# Altium footprint library COMATEL THD.PcbLib: 70 footprints (part 2 of 5)
Each footprint in its own frame and in the unit in brackets; x right, y up, seen from the top. Pads: shape width x height; smd on the part's side, far side on the other; paste and mask are expansions set on the pad; w line width, h text height; cw(c..) or ccw(c..) is an arc to the next point about the centre after c.
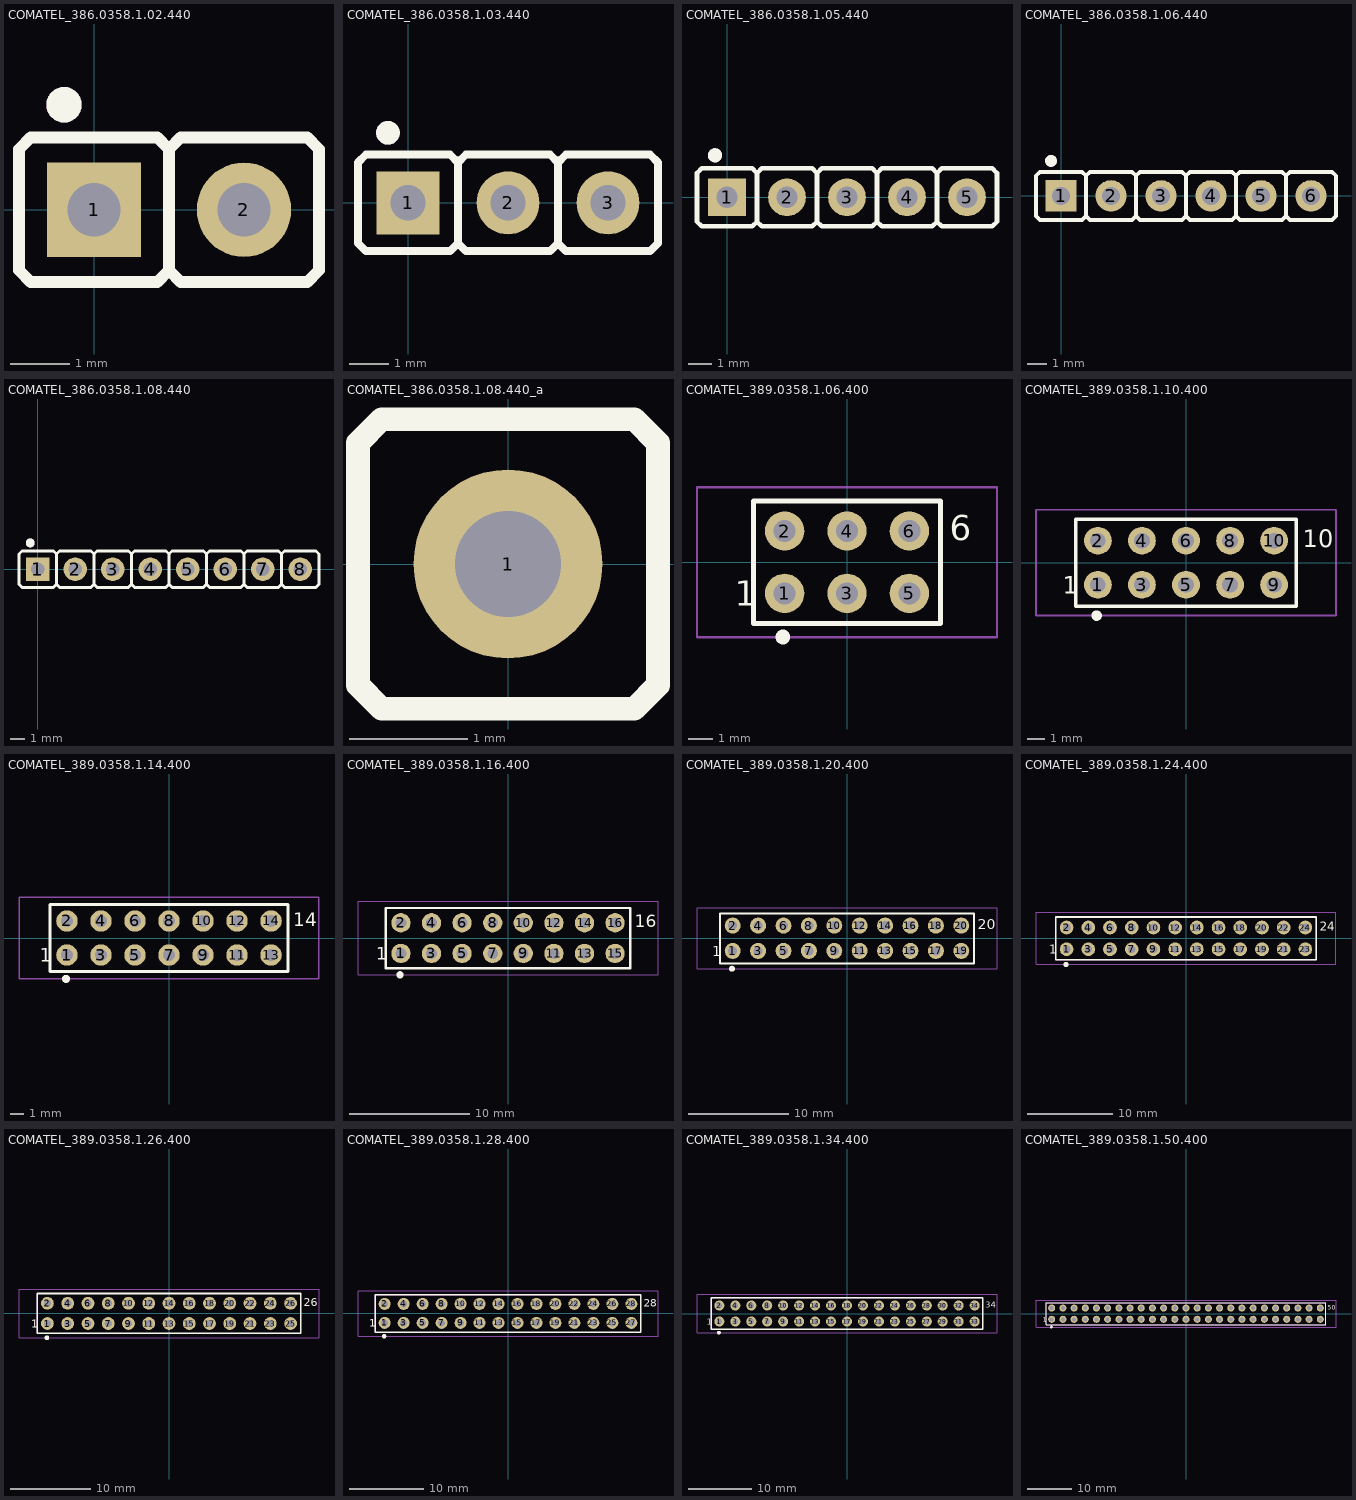
[diagram p1: the footprints below, top view; thin cyan lines are the x and y axes]

## COMATEL_386.0358.1.02.440 [mm] "2 Contacts Straight Strip Header Pitch 2.54mm L=6.3mm ''Mini-Wire-Wrap''"
height 8
pads (2):
  rect 1.6x1.6 hole 0.9: 1(0,0)
  round 1.6 hole 0.9: 2(2.54,0)
Top Overlay:
  circle w0.3: c-0.508,1.778 r0.15
  lines w0.2: 1.27,-1.025 1.47,-1.225 3.61,-1.225 3.81,-1.025 3.81,1.025 3.61,1.225 1.47,1.225 1.27,1.025 ; 1.27,-1.025 1.27,1.025 ; 1.27,-1.025 1.07,-1.225 -1.07,-1.225 -1.27,-1.025 -1.27,1.025 -1.07,1.225 1.07,1.225 1.27,1.025
Mechanical 14:
  circle w0.3: c-0.508,1.778 r0.15
  lines w0.1: 1.27,-1.025 1.47,-1.225 3.61,-1.225 3.81,-1.025 3.81,1.025 3.61,1.225 1.47,1.225 1.27,1.025 ; 1.27,-1.025 1.27,1.025 ; 1.27,-1.025 1.07,-1.225 -1.07,-1.225 -1.27,-1.025 -1.27,1.025 -1.07,1.225 1.07,1.225 1.27,1.025
3D body "COMATEL_386.0358.1.02.440.stp": height 8, standoff -3.2, extent -1.27,-1.225 3.81,1.225

## COMATEL_386.0358.1.03.440 [mm] "3 Contacts Straight Strip Header Pitch 2.54mm L=6.3mm ''Mini-Wire-Wrap''"
height 8
pads (3):
  rect 1.6x1.6 hole 0.9: 1(0,0)
  round 1.6 hole 0.9: 2(2.54,0) 3(5.08,0)
Top Overlay:
  circle w0.3: c-0.508,1.778 r0.15
  lines w0.2: 1.27,-1.025 1.07,-1.225 -1.07,-1.225 -1.27,-1.025 -1.27,1.025 -1.07,1.225 1.07,1.225 1.27,1.025 ; 1.27,-1.025 1.27,1.025 ; 1.27,-1.025 1.47,-1.225 3.61,-1.225 3.81,-1.025 ; 1.27,1.025 1.47,1.225 3.61,1.225 3.81,1.025 ; 3.81,-1.025 3.81,1.025 ; 3.81,-1.025 4.01,-1.225 6.15,-1.225 6.35,-1.025 6.35,1.025 6.15,1.225 4.01,1.225 3.81,1.025
Mechanical 14:
  circle w0.3: c-0.508,1.778 r0.15
  lines w0.1: 1.27,-1.025 1.07,-1.225 -1.07,-1.225 -1.27,-1.025 -1.27,1.025 -1.07,1.225 1.07,1.225 1.27,1.025 ; 1.27,-1.025 1.27,1.025 ; 1.27,-1.025 1.47,-1.225 3.61,-1.225 3.81,-1.025 ; 1.27,1.025 1.47,1.225 3.61,1.225 3.81,1.025 ; 3.81,-1.025 3.81,1.025 ; 3.81,-1.025 4.01,-1.225 6.15,-1.225 6.35,-1.025 6.35,1.025 6.15,1.225 4.01,1.225 3.81,1.025
3D body "COMATEL_386.0358.1.03.440.stp": height 8, standoff -3.2, extent -1.27,-1.225 6.35,1.225

## COMATEL_386.0358.1.05.440 [mm] "5 Contacts Straight Strip Header Pitch 2.54mm L=6.3mm ''Mini-Wire-Wrap''"
height 8
pads (5):
  rect 1.6x1.6 hole 0.9: 1(0,0)
  round 1.6 hole 0.9: 2(2.54,0) 3(5.08,0) 4(7.62,0) 5(10.16,0)
Top Overlay:
  circle w0.3: c-0.508,1.778 r0.15
  lines w0.2: 1.27,-1.025 1.07,-1.225 -1.07,-1.225 -1.27,-1.025 -1.27,1.025 -1.07,1.225 1.07,1.225 1.27,1.025 ; 1.27,-1.025 1.27,1.025 ; 1.27,-1.025 1.47,-1.225 3.61,-1.225 3.81,-1.025 ; 1.27,1.025 1.47,1.225 3.61,1.225 3.81,1.025 ; 3.81,-1.025 3.81,1.025 ; 3.81,-1.025 4.01,-1.225 6.15,-1.225 6.35,-1.025 ; 3.81,1.025 4.01,1.225 6.15,1.225 6.35,1.025 ; 6.35,-1.025 6.35,1.025 ; 6.35,-1.025 6.55,-1.225 8.69,-1.225 8.89,-1.025 ; 6.35,1.025 6.55,1.225 8.69,1.225 8.89,1.025 ; 8.89,-1.025 9.09,-1.225 11.23,-1.225 11.43,-1.025 11.43,1.025 11.23,1.225 9.09,1.225 8.89,1.025 ; 8.89,-1.025 8.89,1.025
Mechanical 14:
  circle w0.3: c-0.508,1.778 r0.15
  lines w0.1: 1.27,-1.025 1.07,-1.225 -1.07,-1.225 -1.27,-1.025 -1.27,1.025 -1.07,1.225 1.07,1.225 1.27,1.025 ; 1.27,-1.025 1.27,1.025 ; 1.27,-1.025 1.47,-1.225 3.61,-1.225 3.81,-1.025 ; 1.27,1.025 1.47,1.225 3.61,1.225 3.81,1.025 ; 3.81,-1.025 3.81,1.025 ; 3.81,-1.025 4.01,-1.225 6.15,-1.225 6.35,-1.025 ; 3.81,1.025 4.01,1.225 6.15,1.225 6.35,1.025 ; 6.35,-1.025 6.55,-1.225 8.69,-1.225 8.89,-1.025 ; 6.35,-1.025 6.35,1.025 ; 6.35,1.025 6.55,1.225 8.69,1.225 8.89,1.025 ; 8.89,-1.025 9.09,-1.225 11.23,-1.225 11.43,-1.025 11.43,1.025 11.23,1.225 9.09,1.225 8.89,1.025 ; 8.89,-1.025 8.89,1.025
3D body "COMATEL_386.0358.1.05.440.stp": height 8, standoff -3.2, extent -1.27,-1.225 11.43,1.225

## COMATEL_386.0358.1.06.440 [mm] "6 Contacts Straight Strip Header Pitch 2.54mm L=6.3mm ''Mini-Wire-Wrap''"
height 8
pads (6):
  rect 1.6x1.6 hole 0.9: 1(0,0)
  round 1.6 hole 0.9: 2(2.54,0) 3(5.08,0) 4(7.62,0) 5(10.16,0) 6(12.7,0)
Top Overlay:
  circle w0.3: c-0.508,1.778 r0.15
  lines w0.2: 1.27,-1.025 1.07,-1.225 -1.07,-1.225 -1.27,-1.025 -1.27,1.025 -1.07,1.225 1.07,1.225 1.27,1.025 ; 1.27,-1.025 1.27,1.025 ; 1.27,-1.025 1.47,-1.225 3.61,-1.225 3.81,-1.025 ; 1.27,1.025 1.47,1.225 3.61,1.225 3.81,1.025 ; 3.81,-1.025 3.81,1.025 ; 3.81,-1.025 4.01,-1.225 6.15,-1.225 6.35,-1.025 ; 3.81,1.025 4.01,1.225 6.15,1.225 6.35,1.025 ; 6.35,-1.025 6.35,1.025 ; 6.35,-1.025 6.55,-1.225 8.69,-1.225 8.89,-1.025 ; 6.35,1.025 6.55,1.225 8.69,1.225 8.89,1.025 ; 8.89,-1.025 9.09,-1.225 11.23,-1.225 11.43,-1.025 ; 8.89,-1.025 8.89,1.025 ; 8.89,1.025 9.09,1.225 11.23,1.225 11.43,1.025 ; 11.43,-1.025 11.63,-1.225 13.77,-1.225 13.97,-1.025 13.97,1.025 13.77,1.225 11.63,1.225 11.43,1.025 ; 11.43,-1.025 11.43,1.025
Mechanical 14:
  circle w0.3: c-0.508,1.778 r0.15
  lines w0.1: 1.27,-1.025 1.07,-1.225 -1.07,-1.225 -1.27,-1.025 -1.27,1.025 -1.07,1.225 1.07,1.225 1.27,1.025 ; 1.27,-1.025 1.27,1.025 ; 1.27,-1.025 1.47,-1.225 3.61,-1.225 3.81,-1.025 ; 1.27,1.025 1.47,1.225 3.61,1.225 3.81,1.025 ; 3.81,-1.025 3.81,1.025 ; 3.81,-1.025 4.01,-1.225 6.15,-1.225 6.35,-1.025 ; 3.81,1.025 4.01,1.225 6.15,1.225 6.35,1.025 ; 6.35,-1.025 6.55,-1.225 8.69,-1.225 8.89,-1.025 ; 6.35,-1.025 6.35,1.025 ; 6.35,1.025 6.55,1.225 8.69,1.225 8.89,1.025 ; 8.89,-1.025 9.09,-1.225 11.23,-1.225 11.43,-1.025 ; 8.89,-1.025 8.89,1.025 ; 8.89,1.025 9.09,1.225 11.23,1.225 11.43,1.025 ; 11.43,-1.025 11.63,-1.225 13.77,-1.225 13.97,-1.025 13.97,1.025 13.77,1.225 11.63,1.225 11.43,1.025 ; 11.43,-1.025 11.43,1.025
3D body "COMATEL_386.0358.1.06.440.stp": height 8, standoff -3.2, extent -1.27,-1.225 13.97,1.225

## COMATEL_386.0358.1.08.440 [mm] "8 Contacts Straight Strip Header Pitch 2.54mm L=6.3mm ''Mini-Wire-Wrap''"
height 8
pads (8):
  rect 1.6x1.6 hole 0.9: 1(0,0)
  round 1.6 hole 0.9: 2(2.54,0) 3(5.08,0) 4(7.62,0) 5(10.16,0) 6(12.7,0) 7(15.24,0) 8(17.78,0)
Top Overlay:
  circle w0.3: c-0.508,1.778 r0.15
  lines w0.2: 1.27,-1.025 1.47,-1.225 3.61,-1.225 3.81,-1.025 ; 1.27,-1.025 1.27,1.025 ; 1.27,-1.025 1.07,-1.225 -1.07,-1.225 -1.27,-1.025 -1.27,1.025 -1.07,1.225 1.07,1.225 1.27,1.025 ; 1.27,1.025 1.47,1.225 3.61,1.225 3.81,1.025 ; 3.81,-1.025 4.01,-1.225 6.15,-1.225 6.35,-1.025 ; 3.81,-1.025 3.81,1.025 ; 3.81,1.025 4.01,1.225 6.15,1.225 6.35,1.025 ; 6.35,-1.025 6.55,-1.225 8.69,-1.225 8.89,-1.025 ; 6.35,-1.025 6.35,1.025 ; 6.35,1.025 6.55,1.225 8.69,1.225 8.89,1.025 ; 8.89,-1.025 9.09,-1.225 11.23,-1.225 11.43,-1.025 ; 8.89,-1.025 8.89,1.025 ; 8.89,1.025 9.09,1.225 11.23,1.225 11.43,1.025 ; 11.43,-1.025 11.63,-1.225 13.77,-1.225 13.97,-1.025 ; 11.43,-1.025 11.43,1.025 ; 11.43,1.025 11.63,1.225 13.77,1.225 13.97,1.025 ; 13.97,-1.025 14.17,-1.225 16.31,-1.225 16.51,-1.025 ; 13.97,-1.025 13.97,1.025 ; 13.97,1.025 14.17,1.225 16.31,1.225 16.51,1.025 ; 16.51,-1.025 16.71,-1.225 18.85,-1.225 19.05,-1.025 19.05,1.025 18.85,1.225 16.71,1.225 16.51,1.025 ; 16.51,-1.025 16.51,1.025
Mechanical 14:
  circle w0.3: c-0.508,1.778 r0.15
  lines w0.1: 1.27,-1.025 1.47,-1.225 3.61,-1.225 3.81,-1.025 ; 1.27,-1.025 1.07,-1.225 -1.07,-1.225 -1.27,-1.025 -1.27,1.025 -1.07,1.225 1.07,1.225 1.27,1.025 ; 1.27,-1.025 1.27,1.025 ; 1.27,1.025 1.47,1.225 3.61,1.225 3.81,1.025 ; 3.81,-1.025 4.01,-1.225 6.15,-1.225 6.35,-1.025 ; 3.81,-1.025 3.81,1.025 ; 3.81,1.025 4.01,1.225 6.15,1.225 6.35,1.025 ; 6.35,-1.025 6.55,-1.225 8.69,-1.225 8.89,-1.025 ; 6.35,-1.025 6.35,1.025 ; 6.35,1.025 6.55,1.225 8.69,1.225 8.89,1.025 ; 8.89,-1.025 9.09,-1.225 11.23,-1.225 11.43,-1.025 ; 8.89,-1.025 8.89,1.025 ; 8.89,1.025 9.09,1.225 11.23,1.225 11.43,1.025 ; 11.43,-1.025 11.63,-1.225 13.77,-1.225 13.97,-1.025 ; 11.43,-1.025 11.43,1.025 ; 11.43,1.025 11.63,1.225 13.77,1.225 13.97,1.025 ; 13.97,-1.025 14.17,-1.225 16.31,-1.225 16.51,-1.025 ; 13.97,-1.025 13.97,1.025 ; 13.97,1.025 14.17,1.225 16.31,1.225 16.51,1.025 ; 16.51,-1.025 16.71,-1.225 18.85,-1.225 19.05,-1.025 19.05,1.025 18.85,1.225 16.71,1.225 16.51,1.025 ; 16.51,-1.025 16.51,1.025
3D body "COMATEL_386.0358.1.08.440.stp": height 8, standoff -3.2, extent -1.27,-1.225 19.05,1.225

## COMATEL_386.0358.1.08.440_a [mm] "1 Out of 8 Contacts of  Straight Strip Header Pitch 2.54mm L=6.3mm ''Mini-Wire-Wrap''"
height 8
pads (1):
  round 1.6 hole 0.9: 1(0,0)
Top Overlay:
  lines w0.2: -1.27,-1.025 -1.27,1.025 -1.07,1.225 1.07,1.225 1.27,1.025 1.27,-1.025 1.07,-1.225 -1.07,-1.225 -1.27,-1.025
Mechanical 14:
  lines w0.1: -1.27,-1.025 -1.07,-1.225 1.07,-1.225 1.27,-1.025 1.27,1.025 1.07,1.225 -1.07,1.225 -1.27,1.025 -1.27,-1.025
3D body "COMATEL_386.0358.1.08.440_a.stp": height 8, standoff -3.2, extent -1.27,-1.225 1.27,1.225

## COMATEL_389.0358.1.06.400 [mm] "6 Contacts - Pitch 2.54mm - Dual Row Straight Strip Header - Insulator 1.7mm"
height 8
pads (6):
  round 1.6 hole 0.9: 1(-2.54,-1.27) 2(-2.54,1.27) 3(0,-1.27) 4(0,1.27) 5(2.54,-1.27) 6(2.54,1.27)
Top Overlay:
  circle w0.3: c-2.613,-3.048 r0.15
  lines w0.2: -3.81,-2.5 3.81,-2.5 3.81,2.5 -3.81,2.5 -3.81,-2.5
  text "6" at 4.191,0.889 h1.02
  text "1" at -4.572,-1.778 h1.02
Mechanical 8:
  lines w0.1: -6.11,-3.05 6.11,-3.05 6.11,3.05 -6.11,3.05 -6.11,-3.05
Mechanical 14:
  lines w0.1: -3.81,-2.5 -3.81,2.5 3.81,2.5 3.81,-2.5 -3.81,-2.5
3D body "COMATEL_389.0358.1.06.400.stp": height 8, standoff -3.2, extent -3.81,-3 3.81,2.5

## COMATEL_389.0358.1.10.400 [mm] "10 Contacts - Pitch 2.54mm - Dual Row Straight Strip Header - Insulator 1.7mm"
height 8
pads (10):
  round 1.6 hole 0.9: 1(-5.08,-1.27) 2(-5.08,1.27) 3(-2.54,-1.27) 4(-2.54,1.27) 5(0,-1.27) 6(0,1.27) 7(2.54,-1.27) 8(2.54,1.27) 9(5.08,-1.27) 10(5.08,1.27)
Top Overlay:
  circle w0.3: c-5.153,-3.048 r0.15
  lines w0.2: -6.35,-2.5 -6.35,2.5 6.35,2.5 6.35,-2.5 -6.35,-2.5
  text "1" at -7.112,-1.778 h1.02
  text "10" at 6.731,0.889 h1.02
Mechanical 8:
  lines w0.1: -8.65,-3.05 -8.65,3.05 8.65,3.05 8.65,-3.05 -8.65,-3.05
Mechanical 14:
  lines w0.1: -6.35,-2.5 6.35,-2.5 6.35,2.5 -6.35,2.5 -6.35,-2.5
3D body "COMATEL_389.0358.1.10.400.stp": height 8, standoff -3.2, extent -6.35,-3 6.35,2.5

## COMATEL_389.0358.1.14.400 [mm] "14 Contacts - Pitch 2.54mm - Dual Row Straight Strip Header - Insulator 1.7mm"
height 8
pads (14):
  round 1.6 hole 0.9: 1(-7.62,-1.27) 2(-7.62,1.27) 3(-5.08,-1.27) 4(-5.08,1.27) 5(-2.54,-1.27) 6(-2.54,1.27) 7(0,-1.27) 8(0,1.27) 9(2.54,-1.27) 10(2.54,1.27) 11(5.08,-1.27) 12(5.08,1.27) 13(7.62,-1.27) 14(7.62,1.27)
Top Overlay:
  circle w0.3: c-7.693,-3.048 r0.15
  lines w0.2: -8.89,-2.5 -8.89,2.5 8.89,2.5 8.89,-2.5 -8.89,-2.5
  text "14" at 9.271,0.889 h1.02
  text "1" at -9.652,-1.778 h1.02
Mechanical 8:
  lines w0.1: -11.2,-3.05 -11.2,3.05 11.2,3.05 11.2,-3.05 -11.2,-3.05
Mechanical 14:
  lines w0.1: -8.89,-2.5 8.89,-2.5 8.89,2.5 -8.89,2.5 -8.89,-2.5
3D body "COMATEL_389.0358.1.14.400.stp": height 8, standoff -3.2, extent -8.89,-3 8.89,2.5

## COMATEL_389.0358.1.16.400 [mm] "16 Contacts - Pitch 2.54mm - Dual Row Straight Strip Header - Insulator 1.7mm"
height 8
pads (16):
  round 1.6 hole 0.9: 1(-8.89,-1.27) 2(-8.89,1.27) 3(-6.35,-1.27) 4(-6.35,1.27) 5(-3.81,-1.27) 6(-3.81,1.27) 7(-1.27,-1.27) 8(-1.27,1.27) 9(1.27,-1.27) 10(1.27,1.27) 11(3.81,-1.27) 12(3.81,1.27) 13(6.35,-1.27) 14(6.35,1.27) 15(8.89,-1.27) 16(8.89,1.27)
Top Overlay:
  circle w0.3: c-8.963,-3.048 r0.15
  lines w0.2: -10.16,-2.5 10.16,-2.5 10.16,2.5 -10.16,2.5 -10.16,-2.5
  text "1" at -10.922,-1.778 h1.02
  text "16" at 10.541,0.889 h1.02
Mechanical 8:
  lines w0.1: -12.45,-3.05 12.45,-3.05 12.45,3.05 -12.45,3.05 -12.45,-3.05
Mechanical 14:
  lines w0.1: -10.16,-2.5 10.16,-2.5 10.16,2.5 -10.16,2.5 -10.16,-2.5
3D body "COMATEL_389.0358.1.16.400.stp": height 8, standoff -3.2, extent -10.16,-3 10.16,2.5

## COMATEL_389.0358.1.20.400 [mm] "20 Contacts - Pitch 2.54mm - Dual Row Straight Strip Header - Insulator 1.7mm"
height 8
pads (20):
  round 1.6 hole 0.9: 1(-11.43,-1.27) 2(-11.43,1.27) 3(-8.89,-1.27) 4(-8.89,1.27) 5(-6.35,-1.27) 6(-6.35,1.27) 7(-3.81,-1.27) 8(-3.81,1.27) 9(-1.27,-1.27) 10(-1.27,1.27) 11(1.27,-1.27) 12(1.27,1.27) 13(3.81,-1.27) 14(3.81,1.27) 15(6.35,-1.27) 16(6.35,1.27) 17(8.89,-1.27) 18(8.89,1.27) 19(11.43,-1.27) 20(11.43,1.27)
Top Overlay:
  circle w0.3: c-11.503,-3.048 r0.15
  lines w0.2: -12.7,-2.5 -12.7,2.5 12.7,2.5 12.7,-2.5 -12.7,-2.5
  text "20" at 13.081,0.889 h1.02
  text "1" at -13.462,-1.778 h1.02
Mechanical 8:
  lines w0.1: -15,-3.05 -15,3.05 15,3.05 15,-3.05 -15,-3.05
Mechanical 14:
  lines w0.1: -12.7,-2.5 -12.7,2.5 12.7,2.5 12.7,-2.5 -12.7,-2.5
3D body "COMATEL_389.0358.1.20.400.stp": height 8, standoff -3.2, extent -12.7,-3 12.7,2.5

## COMATEL_389.0358.1.24.400 [mm] "24 Contacts - Pitch 2.54mm - Dual Row Straight Strip Header - Insulator 1.7mm"
height 8
pads (24):
  round 1.6 hole 0.9: 1(-13.97,-1.27) 2(-13.97,1.27) 3(-11.43,-1.27) 4(-11.43,1.27) 5(-8.89,-1.27) 6(-8.89,1.27) 7(-6.35,-1.27) 8(-6.35,1.27) 9(-3.81,-1.27) 10(-3.81,1.27) 11(-1.27,-1.27) 12(-1.27,1.27) 13(1.27,-1.27) 14(1.27,1.27) 15(3.81,-1.27) 16(3.81,1.27) 17(6.35,-1.27) 18(6.35,1.27) 19(8.89,-1.27) 20(8.89,1.27) 21(11.43,-1.27) 22(11.43,1.27) 23(13.97,-1.27) 24(13.97,1.27)
Top Overlay:
  circle w0.3: c-14.043,-3.048 r0.15
  lines w0.2: -15.24,-2.5 15.24,-2.5 15.24,2.5 -15.24,2.5 -15.24,-2.5
  text "24" at 15.621,0.889 h1.02
  text "1" at -16.002,-1.778 h1.02
Mechanical 8:
  lines w0.1: -17.55,-3.05 17.55,-3.05 17.55,3.05 -17.55,3.05 -17.55,-3.05
Mechanical 14:
  lines w0.1: -15.24,-2.5 15.24,-2.5 15.24,2.5 -15.24,2.5 -15.24,-2.5
3D body "COMATEL_389.0358.1.24.400.stp": height 8, standoff -3.2, extent -15.24,-3 15.24,2.5

## COMATEL_389.0358.1.26.400 [mm] "26 Contacts - Pitch 2.54mm - Dual Row Straight Strip Header - Insulator 1.7mm"
height 8
pads (26):
  round 1.6 hole 0.9: 1(-15.24,-1.27) 2(-15.24,1.27) 3(-12.7,-1.27) 4(-12.7,1.27) 5(-10.16,-1.27) 6(-10.16,1.27) 7(-7.62,-1.27) 8(-7.62,1.27) 9(-5.08,-1.27) 10(-5.08,1.27) 11(-2.54,-1.27) 12(-2.54,1.27) 13(0,-1.27) 14(0,1.27) 15(2.54,-1.27) 16(2.54,1.27) 17(5.08,-1.27) 18(5.08,1.27) 19(7.62,-1.27) 20(7.62,1.27) 21(10.16,-1.27) 22(10.16,1.27) 23(12.7,-1.27) 24(12.7,1.27) 25(15.24,-1.27) 26(15.24,1.27)
Top Overlay:
  circle w0.3: c-15.313,-3.048 r0.15
  lines w0.2: -16.51,-2.5 16.51,-2.5 16.51,2.5 -16.51,2.5 -16.51,-2.5
  text "1" at -17.272,-1.778 h1.02
  text "26" at 16.891,0.889 h1.02
Mechanical 8:
  lines w0.1: -18.8,-3.05 18.8,-3.05 18.8,3.05 -18.8,3.05 -18.8,-3.05
Mechanical 14:
  lines w0.1: -16.51,-2.5 16.51,-2.5 16.51,2.5 -16.51,2.5 -16.51,-2.5
3D body "COMATEL_389.0358.1.26.400.stp": height 8, standoff -3.2, extent -16.51,-3 16.51,2.5

## COMATEL_389.0358.1.28.400 [mm] "28 Contacts - Pitch 2.54mm - Dual Row Straight Strip Header - Insulator 1.7mm"
height 8
pads (28):
  round 1.6 hole 0.9: 1(-16.51,-1.27) 2(-16.51,1.27) 3(-13.97,-1.27) 4(-13.97,1.27) 5(-11.43,-1.27) 6(-11.43,1.27) 7(-8.89,-1.27) 8(-8.89,1.27) 9(-6.35,-1.27) 10(-6.35,1.27) 11(-3.81,-1.27) 12(-3.81,1.27) 13(-1.27,-1.27) 14(-1.27,1.27) 15(1.27,-1.27) 16(1.27,1.27) 17(3.81,-1.27) 18(3.81,1.27) 19(6.35,-1.27) 20(6.35,1.27) 21(8.89,-1.27) 22(8.89,1.27) 23(11.43,-1.27) 24(11.43,1.27) 25(13.97,-1.27) 26(13.97,1.27) 27(16.51,-1.27) 28(16.51,1.27)
Top Overlay:
  circle w0.3: c-16.583,-3.048 r0.15
  lines w0.2: -17.78,-2.5 -17.78,2.5 17.78,2.5 17.78,-2.5 -17.78,-2.5
  text "1" at -18.542,-1.778 h1.02
  text "28" at 18.161,0.889 h1.02
Mechanical 8:
  lines w0.1: -20.07,-3.05 -20.07,3.05 20.07,3.05 20.07,-3.05 -20.07,-3.05
Mechanical 14:
  lines w0.1: -17.78,-2.5 -17.78,2.5 17.78,2.5 17.78,-2.5 -17.78,-2.5
3D body "COMATEL_389.0358.1.28.400.stp": height 8, standoff -3.2, extent -17.78,-3 17.78,2.5

## COMATEL_389.0358.1.34.400 [mm] "34 Contacts - Pitch 2.54mm - Dual Row Straight Strip Header - Insulator 1.7mm"
height 8
pads (34):
  round 1.6 hole 0.9: 1(-20.32,-1.27) 2(-20.32,1.27) 3(-17.78,-1.27) 4(-17.78,1.27) 5(-15.24,-1.27) 6(-15.24,1.27) 7(-12.7,-1.27) 8(-12.7,1.27) 9(-10.16,-1.27) 10(-10.16,1.27) 11(-7.62,-1.27) 12(-7.62,1.27) 13(-5.08,-1.27) 14(-5.08,1.27) 15(-2.54,-1.27) 16(-2.54,1.27) 17(0,-1.27) 18(0,1.27) 19(2.54,-1.27) 20(2.54,1.27) 21(5.08,-1.27) 22(5.08,1.27) 23(7.62,-1.27) 24(7.62,1.27) 25(10.16,-1.27) 26(10.16,1.27) 27(12.7,-1.27) 28(12.7,1.27) 29(15.24,-1.27) 30(15.24,1.27) 31(17.78,-1.27) 32(17.78,1.27) 33(20.32,-1.27) 34(20.32,1.27)
Top Overlay:
  circle w0.3: c-20.393,-3.048 r0.15
  lines w0.2: -21.59,-2.5 -21.59,2.5 21.59,2.5 21.59,-2.5 -21.59,-2.5
  text "1" at -22.352,-1.778 h1.02
  text "34" at 21.971,0.889 h1.02
Mechanical 8:
  lines w0.1: -23.88,-3.05 -23.88,3.05 23.88,3.05 23.88,-3.05 -23.88,-3.05
Mechanical 14:
  lines w0.1: 21.59,-2.5 21.59,2.5 ; 21.59,-2.5 -21.59,-2.5 -21.59,2.5 21.59,2.5 ; 21.59,-2.5 21.59,2.5
3D body "COMATEL_389.0358.1.34.400.stp": height 8, standoff -3.2, extent -21.59,-3 21.59,2.5

## COMATEL_389.0358.1.50.400 [mm] "50 Contacts - Pitch 2.54mm - Dual Row Straight Strip Header - Insulator 1.7mm"
height 8
pads (50):
  round 1.6 hole 0.9: 1(-30.48,-1.27) 2(-30.48,1.27) 3(-27.94,-1.27) 4(-27.94,1.27) 5(-25.4,-1.27) 6(-25.4,1.27) 7(-22.86,-1.27) 8(-22.86,1.27) 9(-20.32,-1.27) 10(-20.32,1.27) 11(-17.78,-1.27) 12(-17.78,1.27) 13(-15.24,-1.27) 14(-15.24,1.27) 15(-12.7,-1.27) 16(-12.7,1.27) 17(-10.16,-1.27) 18(-10.16,1.27) 19(-7.62,-1.27) 20(-7.62,1.27) 21(-5.08,-1.27) 22(-5.08,1.27) 23(-2.54,-1.27) 24(-2.54,1.27) 25(0,-1.27) 26(0,1.27) 27(2.54,-1.27) 28(2.54,1.27) 29(5.08,-1.27) 30(5.08,1.27) 31(7.62,-1.27) 32(7.62,1.27) 33(10.16,-1.27) 34(10.16,1.27) 35(12.7,-1.27) 36(12.7,1.27) 37(15.24,-1.27) 38(15.24,1.27) 39(17.78,-1.27) 40(17.78,1.27) 41(20.32,-1.27) 42(20.32,1.27) 43(22.86,-1.27) 44(22.86,1.27) 45(25.4,-1.27) 46(25.4,1.27) 47(27.94,-1.27) 48(27.94,1.27) 49(30.48,-1.27) 50(30.48,1.27)
Top Overlay:
  circle w0.3: c-30.553,-3.048 r0.15
  lines w0.2: -31.75,-2.5 31.75,-2.5 31.75,2.5 -31.75,2.5 -31.75,-2.5
  text "50" at 32.131,0.889 h1.02
  text "1" at -32.512,-1.778 h1.02
Mechanical 8:
  lines w0.1: -34.04,-3.05 34.04,-3.05 34.04,3.05 -34.04,3.05 -34.04,-3.05
Mechanical 14:
  lines w0.1: 31.75,-2.5 31.75,2.5 ; 31.75,-2.5 -31.75,-2.5 -31.75,2.5 31.75,2.5 ; 31.75,-2.5 31.75,2.5
3D body "COMATEL_389.0358.1.50.400.stp": height 8, standoff -3.2, extent -31.75,-3 31.75,2.5